# Altium footprint library VESC_MotorController.PcbLib: 146 footprints (part 2 of 10)
Each footprint in its own frame and in the unit in brackets; x right, y up, seen from the top. Pads: shape width x height; smd on the part's side, far side on the other; paste and mask are expansions set on the pad; w line width, h text height; cw(c..) or ccw(c..) is an arc to the next point about the centre after c.
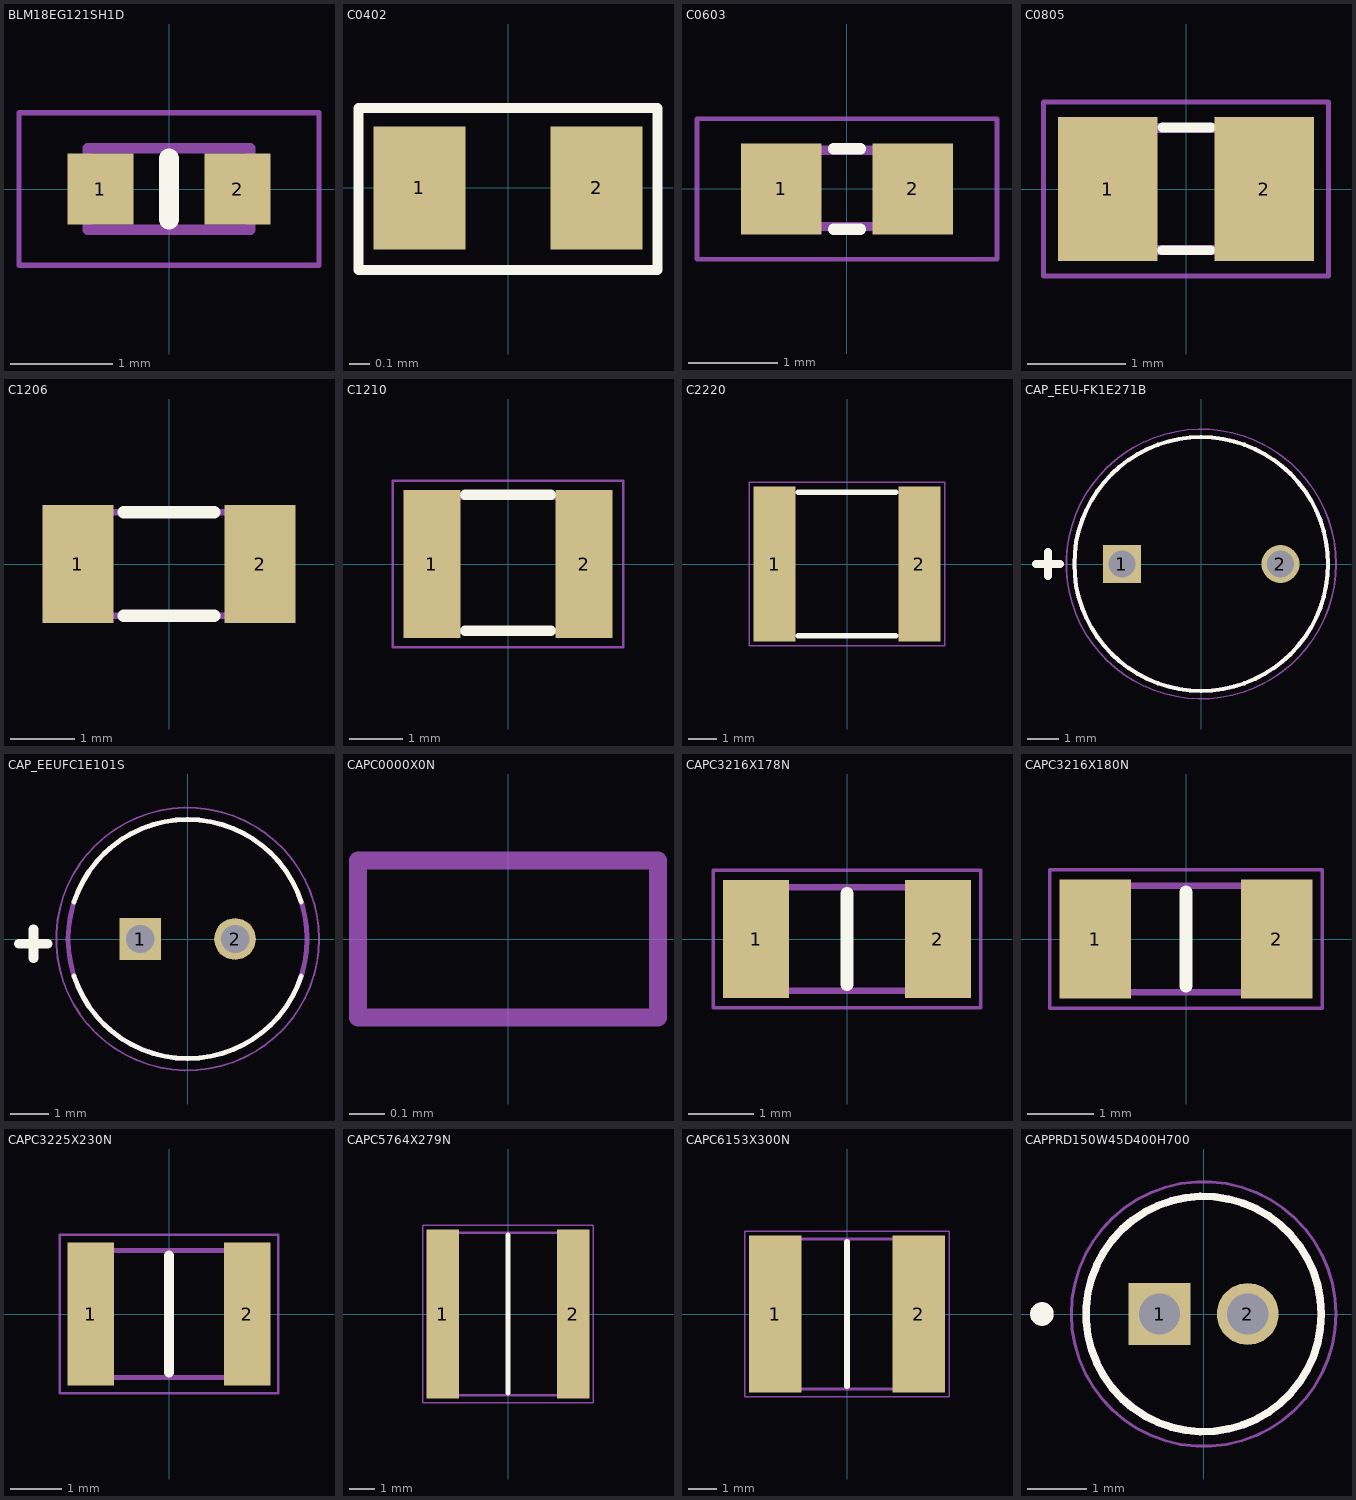
[diagram p1: the footprints below, top view; thin cyan lines are the x and y axes]

## BLM18EG121SH1D [mm]
pads (2):
  rect 0.65x0.7 smd: 1(-0.675,0) 2(0.675,0)
Top Overlay:
  lines w0.2: 0,-0.3 0,0.3
Mechanical 15:
  lines w0.1: -0.8,-0.4 0.8,-0.4 0.8,0.4 -0.8,0.4 -0.8,-0.4
Mechanical 20:
  lines w0.05: -1.475,-0.75 1.475,-0.75 1.475,0.75 -1.475,0.75 -1.475,-0.75
3D body "BLM18AG102SN1D.stp": height 0.81, standoff 0.01, extent -0.8,-0.406 0.8,0.394

## C0402 [mm]
pads (2):
  rect 0.45x0.6 smd: 1(-0.432,0) 2(0.432,0)
Top Overlay:
  lines w0.05: -0.73,-0.4 -0.73,0.39 0.73,0.39 0.73,-0.4 -0.73,-0.4
3D body "CC0402KRX7R8BB104.stp": height 0.51, standoff 0, extent -0.5,-0.275 0.5,0.275

## C0603 [mm] "CAPACITOR SMD 0603"
height 0.9
pads (2):
  rect 0.9x1.02 smd: 1(-0.735,0) 2(0.735,0)
Top Overlay:
  lines w0.127: -0.15,-0.45 0.15,-0.45 ; -0.15,0.45 0.15,0.45
Mechanical 13:
  region: 0.83,-0.471 0.331,-0.471 0.331,0.48 0.83,0.48
  region: -0.338,-0.47 -0.839,-0.47 -0.839,0.48 -0.338,0.48
  lines w0.102: -0.356,-0.419 0.356,-0.419 ; -0.356,0.432 0.356,0.432
Mechanical 15:
  lines w0.051: -1.673,-0.783 -1.673,0.783 1.673,0.783 1.673,-0.783 -1.673,-0.783
3D body "CC0603KRX7R9BB103.STP": height 0.8, standoff 0, extent -0.799,-0.443 0.801,0.457

## C0805 [mm]
pads (2):
  rect 1.02x1.47 smd: 1(-0.8,0) 2(0.8,0)
Top Overlay:
  lines w0.1: -0.246,-0.626 0.25,-0.626 ; -0.241,0.629 0.255,0.629
Mechanical 15:
  lines w0.1: -1,-0.625 -1,0.625 1,0.625 1,-0.625 -1,-0.625
Mechanical 20:
  lines w0.05: -1.46,-0.89 -1.46,0.89 1.46,0.89 1.46,-0.89 -1.46,-0.89
3D body "CC0805KKX7R0BB104.stp": height 1.22, standoff -0.03, extent -0.997,-0.725 1.003,0.725

## C1206 [mm] "CAPACITOR SMD 1206"
height 0.94
pads (2):
  rect 1.1x1.82 smd: 1(-1.41,0) 2(1.41,0)
Top Overlay:
  lines w0.2: -0.7,-0.8 0.7,-0.8 ; -0.7,0.8 0.7,0.8
Mechanical 15:
  lines w0.1: -1.6,-0.8 1.6,-0.8 1.6,0.8 -1.6,0.8 -1.6,-0.8
3D body "CC1206KKX7RABB104.stp": height 1.6, standoff 0, extent -1.6,-0.9 1.6,0.9

## C1210 [mm]
pads (2):
  rect 1.07x2.77 smd: 1(-1.43,0) 2(1.43,0)
Top Overlay:
  lines w0.2: -0.8,-1.25 0.8,-1.25 ; -0.8,1.3 0.8,1.3
Mechanical 15:
  lines w0.1: -1.6,-1.25 -1.6,1.25 1.6,1.25 1.6,-1.25 -1.6,-1.25
Mechanical 20:
  lines w0.05: -2.16,-1.56 -2.16,1.56 2.16,1.56 2.16,-1.56 -2.16,-1.56
3D body "CC1210KFX7R9BB475.stp": height 2.45, standoff -0.05, extent -1.6,-1.4 1.6,1.4

## C2220 [mm]
pads (2):
  rect 1.45x5.41 smd: 1(-2.53,0) 2(2.53,0)
Top Overlay:
  lines w0.2: -1.7,-2.5 1.7,-2.5 ; -1.7,2.5 1.7,2.5
Mechanical 15:
  lines w0.1: -2.85,-2.5 2.85,-2.5 2.85,2.5 -2.85,2.5 -2.85,-2.5
Mechanical 20:
  lines w0.05: -3.405,-2.86 3.405,-2.86 3.405,2.86 -3.405,2.86 -3.405,-2.86
3D body "C2220Y2000225KXTWS2.stp": height 4.5, standoff 0, extent -2.85,-2.5 2.85,2.5

## CAP_EEU-FK1E271B [mm]
height 13.5
pads (2):
  rect 1.2x1.2 hole 0.85: 1(-2.5,0)
  round 1.2 hole 0.85: 2(2.5,0)
Top Overlay:
  circle w0.127: c0,0 r4
  lines w0.254: -5.207,0 -4.445,0 ; -4.826,-0.381 -4.826,0.381
Mechanical 13:
  circle w0.127: c0,0 r4
Mechanical 15:
  circle w0.05: c0,0 r4.25
3D body "step_temp.STEP": height 11.5, standoff -17, extent -4,-4 4,4

## CAP_EEUFC1E101S [mm]
height 13.5
pads (2):
  rect 1.1x1.1 hole 0.75: 1(-1.25,0)
  round 1.1 hole 0.75: 2(1.25,0)
Top Overlay:
  lines w0.127: -2.996,-0.973 ccw(c0,0) 2.996,-0.973 ; -2.996,0.973 cw(c0,0) 2.996,0.973
  lines w0.254: -4.445,-0.127 -3.683,-0.127 ; -4.064,-0.508 -4.064,0.254
Mechanical 13:
  circle w0.127: c0,0 r3.15
Mechanical 15:
  circle w0.05: c0,0 r3.463
3D body "step_temp.STEP": height 11.2, standoff -17, extent -3.15,-3.149 3.15,3.149

## CAPC0000X0N [mm]
Mechanical 20:
  lines w0.05: -0.42,-0.22 -0.42,0.22 0.42,0.22 0.42,-0.22 -0.42,-0.22

## CAPC3216X178N [mm]
pads (2):
  rect 1.02x1.82 smd: 1(-1.4,0) 2(1.4,0)
Top Overlay:
  lines w0.2: 0,-0.7 0,0.7
Mechanical 15:
  lines w0.1: -1.6,-0.8 -1.6,0.8 1.6,0.8 1.6,-0.8 -1.6,-0.8
Mechanical 20:
  lines w0.05: -2.06,-1.06 -2.06,1.06 2.06,1.06 2.06,-1.06 -2.06,-1.06
3D body "12061C225MAT2A.stp": height 1.78, standoff 0, extent -1.6,-0.8 1.6,0.8

## CAPC3216X180N [mm]
pads (2):
  rect 1.07x1.78 smd: 1(-1.36,0) 2(1.36,0)
Top Overlay:
  lines w0.2: 0,-0.7 0,0.7
Mechanical 15:
  lines w0.1: -1.6,-0.8 1.6,-0.8 1.6,0.8 -1.6,0.8 -1.6,-0.8
Mechanical 20:
  lines w0.05: -2.045,-1.04 2.045,-1.04 2.045,1.04 -2.045,1.04 -2.045,-1.04
3D body "HMK316AC7225KL-TE.stp": height 1.8, standoff 0, extent -1.6,-0.8 1.6,0.8

## CAPC3225X230N [mm]
pads (2):
  rect 0.92x2.82 smd: 1(-1.54,0) 2(1.54,0)
Top Overlay:
  lines w0.2: 0,-1.15 0,1.15
Mechanical 15:
  lines w0.1: -1.6,-1.25 1.6,-1.25 1.6,1.25 -1.6,1.25 -1.6,-1.25
Mechanical 20:
  lines w0.05: -2.15,-1.56 2.15,-1.56 2.15,1.56 -2.15,1.56 -2.15,-1.56
3D body "C3225X7R2A106K250AC.stp": height 2.47, standoff -0.03, extent -1.6,-1.25 1.6,1.25

## CAPC5764X279N [mm]
pads (2):
  rect 1.28x6.62 smd: 1(-2.55,0) 2(2.55,0)
Top Overlay:
  lines w0.2: 0,-3.075 0,3.075
Mechanical 15:
  lines w0.1: -2.86,-3.175 2.86,-3.175 2.86,3.175 -2.86,3.175 -2.86,-3.175
Mechanical 20:
  lines w0.05: -3.34,-3.46 3.34,-3.46 3.34,3.46 -3.34,3.46 -3.34,-3.46
3D body "22252C225KAT2A.stp": height 2.79, standoff 0, extent -2.86,-3.175 2.86,3.175

## CAPC6153X300N [mm]
pads (2):
  rect 1.86x5.52 smd: 1(-2.53,0) 2(2.53,0)
Top Overlay:
  lines w0.2: 0,-2.55 0,2.55
Mechanical 15:
  lines w0.1: -3.05,-2.65 -3.05,2.65 3.05,2.65 3.05,-2.65 -3.05,-2.65
Mechanical 20:
  lines w0.05: -3.61,-2.91 -3.61,2.91 3.61,2.91 3.61,-2.91 -3.61,-2.91
3D body "KRM55LR72A475KH01K.stp": height 3, standoff 0, extent -3.05,-2.65 3.05,2.65

## CAPPRD150W45D400H700 [mm]
pads (2):
  rect 1.05x1.05 hole 0.7: 1(-0.75,0)
  round 1.05 hole 0.7: 2(0.75,0)
Top Overlay:
  circle w0.2: c-2.75,0 r0.1
  circle w0.127: c0,0 r2
Mechanical 13:
  circle w0.2: c-2.75,0 r0.1
  circle w0.127: c0,0 r2
Mechanical 15:
  circle w0.05: c0,0 r2.25
3D body "step_temp.STEP": height 7, standoff -17, extent -2,-1.999 2,1.999